# Altium footprint library Wurth_Elektronik_Electromechanic_Wire_to_Board_Connectors_rev16a.PCBLIB: 662 footprints (part 33 of 42)
Each footprint in its own frame and in the unit in brackets; x right, y up, seen from the top. Pads: shape width x height; smd on the part's side, far side on the other; paste and mask are expansions set on the pad; w line width, h text height; cw(c..) or ccw(c..) is an arc to the next point about the centre after c.
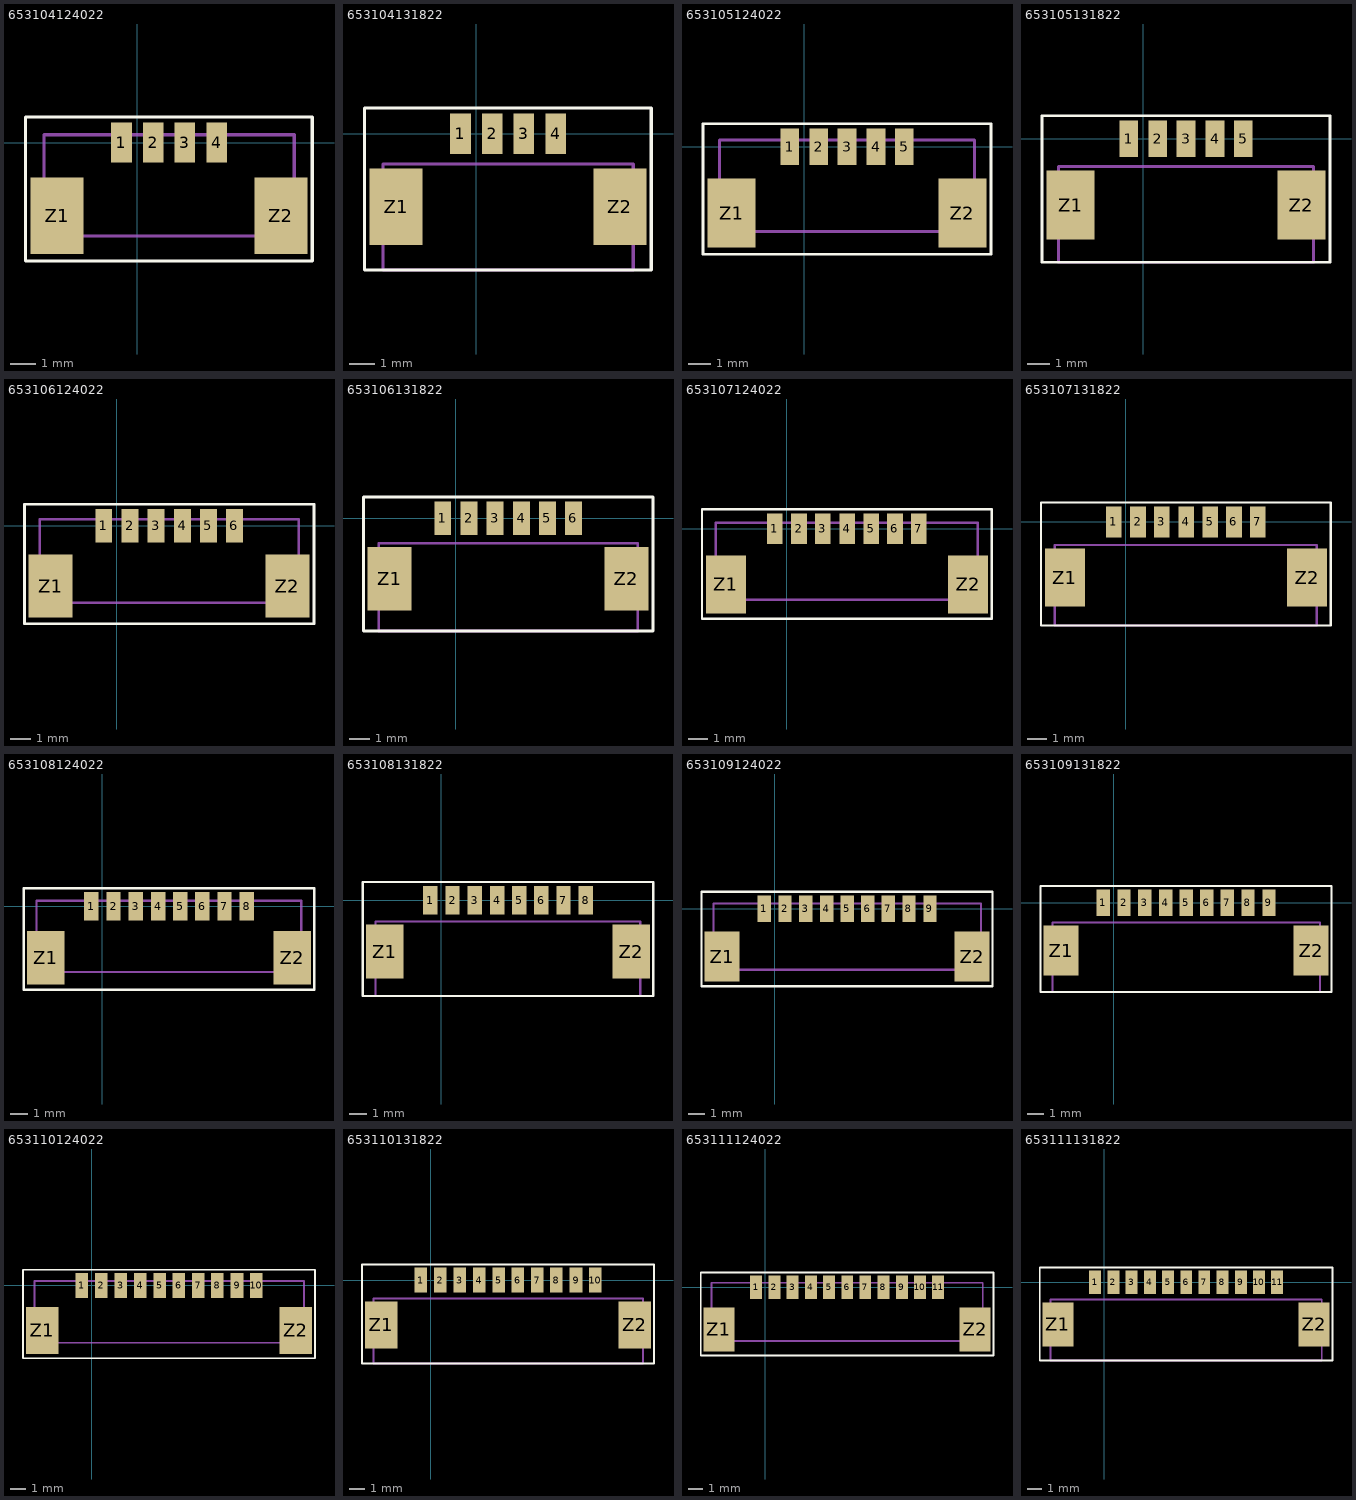
[diagram p32: the footprints below, top view; thin cyan lines are the x and y axes]

## 653104124022 [mil]
pads (6):
  rect 32x63 smd: 1(-24.61,0) 2(25,0) 3(74,0) 4(124,0)
  rect 83x119 smd: Z1(-125,-114.17) Z2(224,-114.17)
Top Overlay:
  lines w5: -174.21,-185.04 273,-185.04 273,40 -174.21,40 -174.21,-185.04
Mechanical 2:
  text ">NAME" at -95.47,54 h77.5
Mechanical 4:
  text ">VALUE" at -69.98,-251.48 h77.5
Mechanical 16:
  lines w5: -145.67,-145.67 245,-145.67 245,12 -145.67,12 -145.67,-145.67
  text "1" at -50,-50 h77.5

## 653104131822 [mil]
pads (6):
  rect 32x63 smd: 1(-24.61,0) 2(25,0) 3(74,0) 4(124,0)
  rect 83x119 smd: Z1(-125,-114.17) Z2(224,-114.17)
Top Overlay:
  lines w5: -174.21,-212.6 273,-212.6 273,40 -174.21,40 -174.21,-212.6
Mechanical 2:
  text ">NAME" at -95.47,54 h77.5
Mechanical 4:
  text ">VALUE" at -69.98,-276.48 h77.5
Mechanical 16:
  lines w5: -145.67,-212.6 245,-212.6 245,-47.24 -145.67,-47.24 -145.67,-212.6
  text "1" at -50,-25 h77.5

## 653105124022 [mil]
pads (7):
  rect 32x63 smd: 1(-24.61,0) 2(25,0) 3(74,0) 4(124,0) 5(173,0)
  rect 83x119 smd: Z1(-125,-114.17) Z2(273,-114.17)
Top Overlay:
  lines w5: -174.21,-185.04 322,-185.04 322,40 -174.21,40 -174.21,-185.04
Mechanical 2:
  text ">NAME" at -70.47,54 h77.5
Mechanical 4:
  text ">VALUE" at -69.98,-251.48 h77.5
Mechanical 16:
  lines w5: -145.67,-145.67 294,-145.67 294,12 -145.67,12 -145.67,-145.67
  text "1" at -50,-50 h77.5

## 653105131822 [mil]
pads (7):
  rect 32x63 smd: 1(-24.61,0) 2(25,0) 3(74,0) 4(124,0) 5(173,0)
  rect 83x119 smd: Z1(-125,-114.17) Z2(273,-114.17)
Top Overlay:
  lines w5: -174.21,-212.6 322,-212.6 322,40 -174.21,40 -174.21,-212.6
Mechanical 2:
  text ">NAME" at -45.47,54 h77.5
Mechanical 4:
  text ">VALUE" at -69.98,-276.48 h77.5
Mechanical 16:
  lines w5: -145.67,-212.6 294,-212.6 294,-47.24 -145.67,-47.24 -145.67,-212.6
  text "1" at -50,-25 h77.5

## 653106124022 [mil]
pads (8):
  rect 32x63 smd: 1(-24.61,0) 2(25,0) 3(74,0) 4(124,0) 5(173,0) 6(222,0)
  rect 83x119 smd: Z1(-125,-114.17) Z2(322,-114.17)
Top Overlay:
  lines w5: -174.21,-185.04 372,-185.04 372,40 -174.21,40 -174.21,-185.04
Mechanical 2:
  text ">NAME" at -45.47,54 h77.5
Mechanical 4:
  text ">VALUE" at -44.98,-251.48 h77.5
Mechanical 16:
  lines w5: -145.67,-145.67 343,-145.67 343,12 -145.67,12 -145.67,-145.67
  text "1" at -50,-50 h77.5

## 653106131822 [mil]
pads (8):
  rect 32x63 smd: 1(-24.61,0) 2(25,0) 3(74,0) 4(124,0) 5(173,0) 6(222,0)
  rect 83x119 smd: Z1(-125,-114.17) Z2(322,-114.17)
Top Overlay:
  lines w5: -174.21,-212.6 372,-212.6 372,40 -174.21,40 -174.21,-212.6
Mechanical 2:
  text ">NAME" at -45.47,54 h77.5
Mechanical 4:
  text ">VALUE" at -44.98,-276.48 h77.5
Mechanical 16:
  lines w5: -145.67,-212.6 343,-212.6 343,-47.24 -145.67,-47.24 -145.67,-212.6
  text "1" at -50,-25 h77.5

## 653107124022 [mil]
pads (9):
  rect 32x63 smd: 1(-24.61,0) 2(25,0) 3(74,0) 4(124,0) 5(173,0) 6(222,0) 7(271,0)
  rect 83x119 smd: Z1(-125,-114.17) Z2(372,-114.17)
Top Overlay:
  lines w5: -174.21,-185.04 421,-185.04 421,40 -174.21,40 -174.21,-185.04
Mechanical 2:
  text ">NAME" at 5,54 h77.5
Mechanical 4:
  text ">VALUE" at 6,-251.48 h77.5
Mechanical 16:
  lines w5: -145.67,-145.67 392,-145.67 392,12 -145.67,12 -145.67,-145.67
  text "1" at -50,-50 h77.5

## 653107131822 [mil]
pads (9):
  rect 32x63 smd: 1(-24.61,0) 2(25,0) 3(74,0) 4(124,0) 5(173,0) 6(222,0) 7(271,0)
  rect 83x119 smd: Z1(-125,-114.17) Z2(372,-114.17)
Top Overlay:
  lines w5: -174.21,-212.6 421,-212.6 421,40 -174.21,40 -174.21,-212.6
Mechanical 2:
  text ">NAME" at 5,54 h77.5
Mechanical 4:
  text ">VALUE" at 6,-251.48 h77.5
Mechanical 16:
  lines w5: -145.67,-212.6 392,-212.6 392,-47.24 -145.67,-47.24 -145.67,-212.6
  text "1" at -50,-25 h77.5

## 653108124022 [mil]
pads (10):
  rect 32x63 smd: 1(-24.61,0) 2(25,0) 3(74,0) 4(124,0) 5(173,0) 6(222,0) 7(271,0) 8(320,0)
  rect 83x119 smd: Z1(-125,-114.17) Z2(421,-114.17)
Top Overlay:
  lines w5: -174.21,-185.04 470,-185.04 470,40 -174.21,40 -174.21,-185.04
Mechanical 2:
  text ">NAME" at 30,54 h77.5
Mechanical 4:
  text ">VALUE" at 6,-251.48 h77.5
Mechanical 16:
  lines w5: -145.67,-145.67 441,-145.67 441,12 -145.67,12 -145.67,-145.67
  text "1" at -50,-50 h77.5

## 653108131822 [mil]
pads (10):
  rect 32x63 smd: 1(-24.61,0) 2(25,0) 3(74,0) 4(124,0) 5(173,0) 6(222,0) 7(271,0) 8(320,0)
  rect 83x119 smd: Z1(-125,-114.17) Z2(421,-114.17)
Top Overlay:
  lines w5: -174.21,-212.6 470,-212.6 470,40 -174.21,40 -174.21,-212.6
Mechanical 2:
  text ">NAME" at 30,54 h77.5
Mechanical 4:
  text ">VALUE" at 6,-276.48 h77.5
Mechanical 16:
  lines w5: -145.67,-212.6 441,-212.6 441,-47.24 -145.67,-47.24 -145.67,-212.6
  text "1" at -50,-25 h77.5

## 653109124022 [mil]
pads (11):
  rect 32x63 smd: 1(-24.61,0) 2(25,0) 3(74,0) 4(124,0) 5(173,0) 6(222,0) 7(271,0) 8(320,0) 9(370,0)
  rect 83x119 smd: Z1(-125,-114.17) Z2(470,-114.17)
Top Overlay:
  lines w5: -174.21,-185.04 519,-185.04 519,40 -174.21,40 -174.21,-185.04
Mechanical 2:
  text ">NAME" at 55,54 h77.5
Mechanical 4:
  text ">VALUE" at 31,-251.48 h77.5
Mechanical 16:
  lines w5: -145.67,-145.67 491,-145.67 491,12 -145.67,12 -145.67,-145.67
  text "1" at -50,-50 h77.5

## 653109131822 [mil]
pads (11):
  rect 32x63 smd: 1(-24.61,0) 2(25,0) 3(74,0) 4(124,0) 5(173,0) 6(222,0) 7(271,0) 8(320,0) 9(370,0)
  rect 83x119 smd: Z1(-125,-114.17) Z2(470,-114.17)
Top Overlay:
  lines w5: -174.21,-212.6 519,-212.6 519,40 -174.21,40 -174.21,-212.6
Mechanical 2:
  text ">NAME" at 55,54 h77.5
Mechanical 4:
  text ">VALUE" at 31,-301.48 h77.5
Mechanical 16:
  lines w5: -145.67,-212.6 491,-212.6 491,-47.24 -145.67,-47.24 -145.67,-212.6
  text "1" at -50,-25 h77.5

## 653110124022 [mil]
pads (12):
  rect 32x63 smd: 1(-24.61,0) 2(25,0) 3(74,0) 4(124,0) 5(173,0) 6(222,0) 7(271,0) 8(320,0) 9(370,0) 10(419,0)
  rect 83x119 smd: Z1(-125,-114.17) Z2(519,-114.17)
Top Overlay:
  lines w5: -174.21,-185.04 568,-185.04 568,40 -174.21,40 -174.21,-185.04
Mechanical 2:
  text ">NAME" at 55,54 h77.5
Mechanical 4:
  text ">VALUE" at 31,-251.48 h77.5
Mechanical 16:
  lines w5: -145.67,-145.67 540,-145.67 540,12 -145.67,12 -145.67,-145.67
  text "1" at -50,-50 h77.5

## 653110131822 [mil]
pads (12):
  rect 32x63 smd: 1(-24.61,0) 2(25,0) 3(74,0) 4(124,0) 5(173,0) 6(222,0) 7(271,0) 8(320,0) 9(370,0) 10(419,0)
  rect 83x119 smd: Z1(-125,-114.17) Z2(519,-114.17)
Top Overlay:
  lines w5: -174.21,-212.6 568,-212.6 568,40 -174.21,40 -174.21,-212.6
Mechanical 2:
  text ">NAME" at 55,54 h77.5
Mechanical 4:
  text ">VALUE" at 56,-276.48 h77.5
Mechanical 16:
  lines w5: -145.67,-212.6 540,-212.6 540,-47.24 -145.67,-47.24 -145.67,-212.6
  text "1" at -50,-25 h77.5

## 653111124022 [mil]
pads (13):
  rect 32x63 smd: 1(-24.61,0) 2(25,0) 3(74,0) 4(124,0) 5(173,0) 6(222,0) 7(271,0) 8(320,0) 9(370,0) 10(419,0) 11(468,0)
  rect 83x119 smd: Z1(-125,-114.17) Z2(568,-114.17)
Top Overlay:
  lines w5: -174.21,-185.04 618,-185.04 618,40 -174.21,40 -174.21,-185.04
Mechanical 2:
  text ">NAME" at 100,50 h77.5
Mechanical 4:
  text ">VALUE" at 100,-250 h77.5
Mechanical 16:
  lines w5: -145.67,-145.67 589,-145.67 589,12 -145.67,12 -145.67,-145.67
  text "1" at -50,-50 h77.5

## 653111131822 [mil]
pads (13):
  rect 32x63 smd: 1(-24.61,0) 2(25,0) 3(74,0) 4(124,0) 5(173,0) 6(222,0) 7(271,0) 8(320,0) 9(370,0) 10(419,0) 11(468,0)
  rect 83x119 smd: Z1(-125,-114.17) Z2(568,-114.17)
Top Overlay:
  lines w5: -174.21,-212.6 618,-212.6 618,40 -174.21,40 -174.21,-212.6
Mechanical 2:
  text ">NAME" at 100,50 h77.5
Mechanical 4:
  text ">VALUE" at 100,-275 h77.5
Mechanical 16:
  lines w5: -145.67,-212.6 589,-212.6 589,-47.24 -145.67,-47.24 -145.67,-212.6
  text "1" at -50,-25 h77.5